# Altium schematic symbol library jlcpcb_2025_04_capacitors_extended_1206.schlib: 2503 symbols (part 10 of 14) (continued)
## FS31X475K250EPG (continued)

## FV31N100J102PXG
designator C?  Capacitance: 10pF  (hidden comment: *)
Capacitor, Ceramic (MLCC), 10pF, ±5%, 1kV, C0G, ±5%, SMD 1206; Manufacturer: PSA(Prosperity Dielectrics); Manufacturer Part Number: FV31N100J102PXG; Package Size: 1206; JLCPCB Basic Part: No; JLCPCB Part Number: C565683; Supplier 1: LCSC; Category: Capacitors - MLCC; Supplier Part Number 1: C565683; Tolerance: ±5%; Voltage Rating: 1kV; Temperature Coefficient: C0G; RoHS: Yes; ComponentLink1Description: Datasheet; ComponentLink1URL: https://wmsc.lcsc.com/wmsc/upload/file/pdf/v2/lcsc/2304140030_PSA-Prosperity-Dielectrics-FV31N100J102PXG_C565683.pdf; ComponentLink2Description: JLCPCB Part URL; ComponentLink2URL: https://jlcpcb.com/partdetail/C565683; ComponentLink3Description: LCSC Part URL; ComponentLink3URL: https://lcsc.com/product-detail/Multilayer-Ceramic-Capacitors-MLCC---SMD-SMT_PSAProsperity-Dielectrics-PSAProsperity-Dielectrics-FV31N100J102PXG_C565683.html
footprint CAP-1206 (1206 (3216M) Capacitor)
pins: 1, 2

## FV31N101J102ECG
designator C?  Capacitance: 100pF  (hidden comment: *)
Capacitor, Ceramic (MLCC), 100pF, ±5%, 1kV, C0G, ±5%, SMD 1206; Manufacturer: PSA(Prosperity Dielectrics); Manufacturer Part Number: FV31N101J102ECG; Package Size: 1206; JLCPCB Basic Part: No; JLCPCB Part Number: C382206; Supplier 1: LCSC; Category: Capacitors - MLCC; Supplier Part Number 1: C382206; Tolerance: ±5%; Voltage Rating: 1kV; Temperature Coefficient: C0G; RoHS: Yes; ComponentLink1Description: Datasheet; ComponentLink1URL: https://wmsc.lcsc.com/wmsc/upload/file/pdf/v2/lcsc/2304140030_PSA-Prosperity-Dielectrics-FV31N101J102ECG_C382206.pdf; ComponentLink2Description: JLCPCB Part URL; ComponentLink2URL: https://jlcpcb.com/partdetail/C382206; ComponentLink3Description: LCSC Part URL; ComponentLink3URL: https://lcsc.com/product-detail/Multilayer-Ceramic-Capacitors-MLCC---SMD-SMT_PSAProsperity-Dielectrics-PSAProsperity-Dielectrics-FV31N101J102ECG_C382206.html
footprint CAP-1206 (1206 (3216M) Capacitor)
pins: 1, 2

## FV31N101J102PXG
designator C?  Capacitance: 100pF  (hidden comment: *)
Capacitor, Ceramic (MLCC), 100pF, ±5%, 1kV, C0G, ±5%, SMD 1206; Manufacturer: PSA(Prosperity Dielectrics); Manufacturer Part Number: FV31N101J102PXG; Package Size: 1206; JLCPCB Basic Part: No; JLCPCB Part Number: C525354; Supplier 1: LCSC; Category: Capacitors - MLCC; Supplier Part Number 1: C525354; Tolerance: ±5%; Voltage Rating: 1kV; Temperature Coefficient: C0G; RoHS: Yes; ComponentLink1Description: Datasheet; ComponentLink1URL: https://wmsc.lcsc.com/wmsc/upload/file/pdf/v2/lcsc/2304140030_PSA-Prosperity-Dielectrics-FV31N101J102PXG_C525354.pdf; ComponentLink2Description: JLCPCB Part URL; ComponentLink2URL: https://jlcpcb.com/partdetail/C525354; ComponentLink3Description: LCSC Part URL; ComponentLink3URL: https://lcsc.com/product-detail/Multilayer-Ceramic-Capacitors-MLCC---SMD-SMT_PSAProsperity-Dielectrics-PSAProsperity-Dielectrics-FV31N101J102PXG_C525354.html
footprint CAP-1206 (1206 (3216M) Capacitor)
pins: 1, 2

## FV31N101J202ECG
designator C?  Capacitance: 100pF  (hidden comment: *)
Capacitor, Ceramic (MLCC), 100pF, ±5%, 2kV, C0G, ±5%, SMD 1206; Manufacturer: PSA(Prosperity Dielectrics); Manufacturer Part Number: FV31N101J202ECG; Package Size: 1206; JLCPCB Basic Part: No; JLCPCB Part Number: C382205; Supplier 1: LCSC; Category: Capacitors - MLCC; Supplier Part Number 1: C382205; Tolerance: ±5%; Voltage Rating: 2kV; Temperature Coefficient: C0G; RoHS: Yes; ComponentLink1Description: Datasheet; ComponentLink1URL: https://wmsc.lcsc.com/wmsc/upload/file/pdf/v2/lcsc/2304140030_PSA-Prosperity-Dielectrics-FV31N101J202ECG_C382205.pdf; ComponentLink2Description: JLCPCB Part URL; ComponentLink2URL: https://jlcpcb.com/partdetail/C382205; ComponentLink3Description: LCSC Part URL; ComponentLink3URL: https://lcsc.com/product-detail/Multilayer-Ceramic-Capacitors-MLCC---SMD-SMT_PSAProsperity-Dielectrics-PSAProsperity-Dielectrics-FV31N101J202ECG_C382205.html
footprint CAP-1206 (1206 (3216M) Capacitor)
pins: 1, 2

## FV31N120J102PXG
designator C?  Capacitance: 12pF  (hidden comment: *)
Capacitor, Ceramic (MLCC), 12pF, ±5%, 1kV, C0G, ±5%, SMD 1206; Manufacturer: PSA(Prosperity Dielectrics); Manufacturer Part Number: FV31N120J102PXG; Package Size: 1206; JLCPCB Basic Part: No; JLCPCB Part Number: C565684; Supplier 1: LCSC; Category: Capacitors - MLCC; Supplier Part Number 1: C565684; Tolerance: ±5%; Voltage Rating: 1kV; Temperature Coefficient: C0G; RoHS: Yes; ComponentLink1Description: Datasheet; ComponentLink1URL: https://wmsc.lcsc.com/wmsc/upload/file/pdf/v2/lcsc/2304140030_PSA-Prosperity-Dielectrics-FV31N120J102PXG_C565684.pdf; ComponentLink2Description: JLCPCB Part URL; ComponentLink2URL: https://jlcpcb.com/partdetail/C565684; ComponentLink3Description: LCSC Part URL; ComponentLink3URL: https://lcsc.com/product-detail/Multilayer-Ceramic-Capacitors-MLCC---SMD-SMT_PSAProsperity-Dielectrics-PSAProsperity-Dielectrics-FV31N120J102PXG_C565684.html
footprint CAP-1206 (1206 (3216M) Capacitor)
pins: 1, 2

## FV31N150J102PXG
designator C?  Capacitance: 15pF  (hidden comment: *)
Capacitor, Ceramic (MLCC), 15pF, ±5%, 1kV, NP0, ±5%, SMD 1206; Manufacturer: PSA(Prosperity Dielectrics); Manufacturer Part Number: FV31N150J102PXG; Package Size: 1206; JLCPCB Basic Part: No; JLCPCB Part Number: C565685; Supplier 1: LCSC; Category: Capacitors - MLCC; Supplier Part Number 1: C565685; Tolerance: ±5%; Voltage Rating: 1kV; Temperature Coefficient: NP0; RoHS: Yes; ComponentLink1Description: Datasheet; ComponentLink1URL: https://wmsc.lcsc.com/wmsc/upload/file/pdf/v2/lcsc/2304140030_PSA-Prosperity-Dielectrics-FV31N150J102PXG_C565685.pdf; ComponentLink2Description: JLCPCB Part URL; ComponentLink2URL: https://jlcpcb.com/partdetail/C565685; ComponentLink3Description: LCSC Part URL; ComponentLink3URL: https://lcsc.com/product-detail/Multilayer-Ceramic-Capacitors-MLCC---SMD-SMT_PSAProsperity-Dielectrics-PSAProsperity-Dielectrics-FV31N150J102PXG_C565685.html
footprint CAP-1206 (1206 (3216M) Capacitor)
pins: 1, 2

## FV31N180J102PXG
designator C?  Capacitance: 18pF  (hidden comment: *)
Capacitor, Ceramic (MLCC), 18pF, ±5%, 1kV, C0G, ±5%, SMD 1206; Manufacturer: PSA(Prosperity Dielectrics); Manufacturer Part Number: FV31N180J102PXG; Package Size: 1206; JLCPCB Basic Part: No; JLCPCB Part Number: C565686; Supplier 1: LCSC; Category: Capacitors - MLCC; Supplier Part Number 1: C565686; Tolerance: ±5%; Voltage Rating: 1kV; Temperature Coefficient: C0G; RoHS: Yes; ComponentLink1Description: Datasheet; ComponentLink1URL: https://wmsc.lcsc.com/wmsc/upload/file/pdf/v2/lcsc/2304140030_PSA-Prosperity-Dielectrics-FV31N180J102PXG_C565686.pdf; ComponentLink2Description: JLCPCB Part URL; ComponentLink2URL: https://jlcpcb.com/partdetail/C565686; ComponentLink3Description: LCSC Part URL; ComponentLink3URL: https://lcsc.com/product-detail/Multilayer-Ceramic-Capacitors-MLCC---SMD-SMT_PSAProsperity-Dielectrics-PSAProsperity-Dielectrics-FV31N180J102PXG_C565686.html
footprint CAP-1206 (1206 (3216M) Capacitor)
pins: 1, 2

## FV31N220J102PXG
designator C?  Capacitance: 22pF  (hidden comment: *)
Capacitor, Ceramic (MLCC), 22pF, ±5%, 1kV, C0G, ±5%, SMD 1206; Manufacturer: PSA(Prosperity Dielectrics); Manufacturer Part Number: FV31N220J102PXG; Package Size: 1206; JLCPCB Basic Part: No; JLCPCB Part Number: C565687; Supplier 1: LCSC; Category: Capacitors - MLCC; Supplier Part Number 1: C565687; Tolerance: ±5%; Voltage Rating: 1kV; Temperature Coefficient: C0G; RoHS: Yes; ComponentLink1Description: Datasheet; ComponentLink1URL: https://wmsc.lcsc.com/wmsc/upload/file/pdf/v2/lcsc/2304140030_PSA-Prosperity-Dielectrics-FV31N220J102PXG_C565687.pdf; ComponentLink2Description: JLCPCB Part URL; ComponentLink2URL: https://jlcpcb.com/partdetail/C565687; ComponentLink3Description: LCSC Part URL; ComponentLink3URL: https://lcsc.com/product-detail/Multilayer-Ceramic-Capacitors-MLCC---SMD-SMT_PSAProsperity-Dielectrics-PSAProsperity-Dielectrics-FV31N220J102PXG_C565687.html
footprint CAP-1206 (1206 (3216M) Capacitor)
pins: 1, 2

## FV31N221J102EEG
designator C?  Capacitance: 220pF  (hidden comment: *)
Capacitor, Ceramic (MLCC), 220pF, 1kV, C0G, SMD 1206; Manufacturer: PSA(Prosperity Dielectrics); Manufacturer Part Number: FV31N221J102EEG; Package Size: 1206; JLCPCB Basic Part: No; JLCPCB Part Number: C2929201; Supplier 1: LCSC; Category: Capacitors - MLCC; Supplier Part Number 1: C2929201; Voltage Rating: 1kV; Temperature Coefficient: C0G; RoHS: Yes; ComponentLink1Description: Datasheet; ComponentLink1URL: https://wmsc.lcsc.com/wmsc/upload/file/pdf/v2/lcsc/2201121400_PSA-Prosperity-Dielectrics-FV31N221J102EEG_C2929201.pdf; ComponentLink2Description: JLCPCB Part URL; ComponentLink2URL: https://jlcpcb.com/partdetail/C2929201; ComponentLink3Description: LCSC Part URL; ComponentLink3URL: https://lcsc.com/product-detail/Multilayer-Ceramic-Capacitors-MLCC---SMD-SMT_PSAProsperity-Dielectrics-PSAProsperity-Dielectrics-FV31N221J102EEG_C2929201.html
footprint CAP-1206 (1206 (3216M) Capacitor)
pins: 1, 2

## FV31N270J102PXG
designator C?  Capacitance: 27pF  (hidden comment: *)
Capacitor, Ceramic (MLCC), 27pF, ±5%, 1kV, C0G, ±5%, SMD 1206; Manufacturer: PSA(Prosperity Dielectrics); Manufacturer Part Number: FV31N270J102PXG; Package Size: 1206; JLCPCB Basic Part: No; JLCPCB Part Number: C565688; Supplier 1: LCSC; Category: Capacitors - MLCC; Supplier Part Number 1: C565688; Tolerance: ±5%; Voltage Rating: 1kV; Temperature Coefficient: C0G; RoHS: Yes; ComponentLink1Description: Datasheet; ComponentLink1URL: https://wmsc.lcsc.com/wmsc/upload/file/pdf/v2/lcsc/2304140030_PSA-Prosperity-Dielectrics-FV31N270J102PXG_C565688.pdf; ComponentLink2Description: JLCPCB Part URL; ComponentLink2URL: https://jlcpcb.com/partdetail/C565688; ComponentLink3Description: LCSC Part URL; ComponentLink3URL: https://lcsc.com/product-detail/Multilayer-Ceramic-Capacitors-MLCC---SMD-SMT_PSAProsperity-Dielectrics-PSAProsperity-Dielectrics-FV31N270J102PXG_C565688.html
footprint CAP-1206 (1206 (3216M) Capacitor)
pins: 1, 2

## FV31N330J102PXG
designator C?  Capacitance: 33pF  (hidden comment: *)
Capacitor, Ceramic (MLCC), 33pF, ±5%, 1kV, C0G, ±5%, SMD 1206; Manufacturer: PSA(Prosperity Dielectrics); Manufacturer Part Number: FV31N330J102PXG; Package Size: 1206; JLCPCB Basic Part: No; JLCPCB Part Number: C565689; Supplier 1: LCSC; Category: Capacitors - MLCC; Supplier Part Number 1: C565689; Tolerance: ±5%; Voltage Rating: 1kV; Temperature Coefficient: C0G; RoHS: Yes; ComponentLink1Description: Datasheet; ComponentLink1URL: https://wmsc.lcsc.com/wmsc/upload/file/pdf/v2/lcsc/2304140030_PSA-Prosperity-Dielectrics-FV31N330J102PXG_C565689.pdf; ComponentLink2Description: JLCPCB Part URL; ComponentLink2URL: https://jlcpcb.com/partdetail/C565689; ComponentLink3Description: LCSC Part URL; ComponentLink3URL: https://lcsc.com/product-detail/Multilayer-Ceramic-Capacitors-MLCC---SMD-SMT_PSAProsperity-Dielectrics-PSAProsperity-Dielectrics-FV31N330J102PXG_C565689.html
footprint CAP-1206 (1206 (3216M) Capacitor)
pins: 1, 2

## FV31N331J102EEG
designator C?  Capacitance: 330pF  (hidden comment: *)
Capacitor, Ceramic (MLCC), 330pF, ±5%, 1kV, C0G, ±5%, SMD 1206; Manufacturer: PSA(Prosperity Dielectrics); Manufacturer Part Number: FV31N331J102EEG; Package Size: 1206; JLCPCB Basic Part: No; JLCPCB Part Number: C146193; Supplier 1: LCSC; Category: Capacitors - MLCC; Supplier Part Number 1: C146193; Tolerance: ±5%; Voltage Rating: 1kV; Temperature Coefficient: C0G; RoHS: Yes; ComponentLink1Description: Datasheet; ComponentLink1URL: https://wmsc.lcsc.com/wmsc/upload/file/pdf/v2/lcsc/2304140030_PSA-Prosperity-Dielectrics-FV31N331J102EEG_C146193.pdf; ComponentLink2Description: JLCPCB Part URL; ComponentLink2URL: https://jlcpcb.com/partdetail/C146193; ComponentLink3Description: LCSC Part URL; ComponentLink3URL: https://lcsc.com/product-detail/Multilayer-Ceramic-Capacitors-MLCC---SMD-SMT_PSAProsperity-Dielectrics-PSAProsperity-Dielectrics-FV31N331J102EEG_C146193.html
footprint CAP-1206 (1206 (3216M) Capacitor)
pins: 1, 2

## FV31N390J102PXG
designator C?  Capacitance: 39pF  (hidden comment: *)
Capacitor, Ceramic (MLCC), 39pF, ±5%, 1kV, C0G, ±5%, SMD 1206; Manufacturer: PSA(Prosperity Dielectrics); Manufacturer Part Number: FV31N390J102PXG; Package Size: 1206; JLCPCB Basic Part: No; JLCPCB Part Number: C565690; Supplier 1: LCSC; Category: Capacitors - MLCC; Supplier Part Number 1: C565690; Tolerance: ±5%; Voltage Rating: 1kV; Temperature Coefficient: C0G; RoHS: Yes; ComponentLink1Description: Datasheet; ComponentLink1URL: https://wmsc.lcsc.com/wmsc/upload/file/pdf/v2/lcsc/2304140030_PSA-Prosperity-Dielectrics-FV31N390J102PXG_C565690.pdf; ComponentLink2Description: JLCPCB Part URL; ComponentLink2URL: https://jlcpcb.com/partdetail/C565690; ComponentLink3Description: LCSC Part URL; ComponentLink3URL: https://lcsc.com/product-detail/Multilayer-Ceramic-Capacitors-MLCC---SMD-SMT_PSAProsperity-Dielectrics-PSAProsperity-Dielectrics-FV31N390J102PXG_C565690.html
footprint CAP-1206 (1206 (3216M) Capacitor)
pins: 1, 2

## FV31N470J102ECG
designator C?  Capacitance: 47pF  (hidden comment: *)
Capacitor, Ceramic (MLCC), 47pF, ±5%, 1kV, C0G, ±5%, SMD 1206; Manufacturer: PSA(Prosperity Dielectrics); Manufacturer Part Number: FV31N470J102ECG; Package Size: 1206; JLCPCB Basic Part: No; JLCPCB Part Number: C701364; Supplier 1: LCSC; Category: Capacitors - MLCC; Supplier Part Number 1: C701364; Tolerance: ±5%; Voltage Rating: 1kV; Temperature Coefficient: C0G; RoHS: Yes; ComponentLink1Description: Datasheet; ComponentLink1URL: https://wmsc.lcsc.com/wmsc/upload/file/pdf/v2/lcsc/2304140030_PSA-Prosperity-Dielectrics-FV31N470J102ECG_C701364.pdf; ComponentLink2Description: JLCPCB Part URL; ComponentLink2URL: https://jlcpcb.com/partdetail/C701364; ComponentLink3Description: LCSC Part URL; ComponentLink3URL: https://lcsc.com/product-detail/Multilayer-Ceramic-Capacitors-MLCC---SMD-SMT_PSAProsperity-Dielectrics-PSAProsperity-Dielectrics-FV31N470J102ECG_C701364.html
footprint CAP-1206 (1206 (3216M) Capacitor)
pins: 1, 2

## FV31N470J102EMG
designator C?  Capacitance: 47pF  (hidden comment: *)
Capacitor, Ceramic (MLCC), 47pF, ±5%, 1kV, C0G, ±5%, SMD 1206; Manufacturer: PSA(Prosperity Dielectrics); Manufacturer Part Number: FV31N470J102EMG; Package Size: 1206; JLCPCB Basic Part: No; JLCPCB Part Number: C382204; Supplier 1: LCSC; Category: Capacitors - MLCC; Supplier Part Number 1: C382204; Tolerance: ±5%; Voltage Rating: 1kV; Temperature Coefficient: C0G; RoHS: Yes; ComponentLink1Description: Datasheet; ComponentLink1URL: https://wmsc.lcsc.com/wmsc/upload/file/pdf/v2/lcsc/2304140030_PSA-Prosperity-Dielectrics-FV31N470J102EMG_C382204.pdf; ComponentLink2Description: JLCPCB Part URL; ComponentLink2URL: https://jlcpcb.com/partdetail/C382204; ComponentLink3Description: LCSC Part URL; ComponentLink3URL: https://lcsc.com/product-detail/Multilayer-Ceramic-Capacitors-MLCC---SMD-SMT_PSAProsperity-Dielectrics-PSAProsperity-Dielectrics-FV31N470J102EMG_C382204.html
footprint CAP-1206 (1206 (3216M) Capacitor)
pins: 1, 2

## FV31N471J102EEG
designator C?  Capacitance: 470pF  (hidden comment: *)
Capacitor, Ceramic (MLCC), 470pF, ±5%, 1kV, C0G, ±5%, SMD 1206; Manufacturer: PSA(Prosperity Dielectrics); Manufacturer Part Number: FV31N471J102EEG; Package Size: 1206; JLCPCB Basic Part: No; JLCPCB Part Number: C382203; Supplier 1: LCSC; Category: Capacitors - MLCC; Supplier Part Number 1: C382203; Tolerance: ±5%; Voltage Rating: 1kV; Temperature Coefficient: C0G; RoHS: Yes; ComponentLink1Description: Datasheet; ComponentLink1URL: https://wmsc.lcsc.com/wmsc/upload/file/pdf/v2/lcsc/2304140030_PSA-Prosperity-Dielectrics-FV31N471J102EEG_C382203.pdf; ComponentLink2Description: JLCPCB Part URL; ComponentLink2URL: https://jlcpcb.com/partdetail/C382203; ComponentLink3Description: LCSC Part URL; ComponentLink3URL: https://lcsc.com/product-detail/Multilayer-Ceramic-Capacitors-MLCC---SMD-SMT_PSAProsperity-Dielectrics-PSAProsperity-Dielectrics-FV31N471J102EEG_C382203.html
footprint CAP-1206 (1206 (3216M) Capacitor)
pins: 1, 2

## FV31N560J102EMG
designator C?  Capacitance: 56pF  (hidden comment: *)
Capacitor, Ceramic (MLCC), 56pF, ±5%, 1kV, C0G, ±5%, SMD 1206; Manufacturer: PSA(Prosperity Dielectrics); Manufacturer Part Number: FV31N560J102EMG; Package Size: 1206; JLCPCB Basic Part: No; JLCPCB Part Number: C565691; Supplier 1: LCSC; Category: Capacitors - MLCC; Supplier Part Number 1: C565691; Tolerance: ±5%; Voltage Rating: 1kV; Temperature Coefficient: C0G; RoHS: Yes; ComponentLink1Description: Datasheet; ComponentLink1URL: https://wmsc.lcsc.com/wmsc/upload/file/pdf/v2/lcsc/2304140030_PSA-Prosperity-Dielectrics-FV31N560J102EMG_C565691.pdf; ComponentLink2Description: JLCPCB Part URL; ComponentLink2URL: https://jlcpcb.com/partdetail/C565691; ComponentLink3Description: LCSC Part URL; ComponentLink3URL: https://lcsc.com/product-detail/Multilayer-Ceramic-Capacitors-MLCC---SMD-SMT_PSAProsperity-Dielectrics-PSAProsperity-Dielectrics-FV31N560J102EMG_C565691.html
footprint CAP-1206 (1206 (3216M) Capacitor)
pins: 1, 2

## FV31N680J102EMG
designator C?  Capacitance: 68pF  (hidden comment: *)
Capacitor, Ceramic (MLCC), 68pF, ±5%, 1kV, C0G, ±5%, SMD 1206; Manufacturer: PSA(Prosperity Dielectrics); Manufacturer Part Number: FV31N680J102EMG; Package Size: 1206; JLCPCB Basic Part: No; JLCPCB Part Number: C525355; Supplier 1: LCSC; Category: Capacitors - MLCC; Supplier Part Number 1: C525355; Tolerance: ±5%; Voltage Rating: 1kV; Temperature Coefficient: C0G; RoHS: Yes; ComponentLink1Description: Datasheet; ComponentLink1URL: https://wmsc.lcsc.com/wmsc/upload/file/pdf/v2/lcsc/2304140030_PSA-Prosperity-Dielectrics-FV31N680J102EMG_C525355.pdf; ComponentLink2Description: JLCPCB Part URL; ComponentLink2URL: https://jlcpcb.com/partdetail/C525355; ComponentLink3Description: LCSC Part URL; ComponentLink3URL: https://lcsc.com/product-detail/Multilayer-Ceramic-Capacitors-MLCC---SMD-SMT_PSAProsperity-Dielectrics-PSAProsperity-Dielectrics-FV31N680J102EMG_C525355.html
footprint CAP-1206 (1206 (3216M) Capacitor)
pins: 1, 2

## FV31N820J102ECG
designator C?  Capacitance: 82pF  (hidden comment: *)
Capacitor, Ceramic (MLCC), 82pF, ±5%, 1kV, NP0, ±5%, SMD 1206; Manufacturer: PSA(Prosperity Dielectrics); Manufacturer Part Number: FV31N820J102ECG; Package Size: 1206; JLCPCB Basic Part: No; JLCPCB Part Number: C565692; Supplier 1: LCSC; Category: Capacitors - MLCC; Supplier Part Number 1: C565692; Tolerance: ±5%; Voltage Rating: 1kV; Temperature Coefficient: NP0; RoHS: Yes; ComponentLink1Description: Datasheet; ComponentLink1URL: https://wmsc.lcsc.com/wmsc/upload/file/pdf/v2/lcsc/2304140030_PSA-Prosperity-Dielectrics-FV31N820J102ECG_C565692.pdf; ComponentLink2Description: JLCPCB Part URL; ComponentLink2URL: https://jlcpcb.com/partdetail/C565692; ComponentLink3Description: LCSC Part URL; ComponentLink3URL: https://lcsc.com/product-detail/Multilayer-Ceramic-Capacitors-MLCC---SMD-SMT_PSAProsperity-Dielectrics-PSAProsperity-Dielectrics-FV31N820J102ECG_C565692.html
footprint CAP-1206 (1206 (3216M) Capacitor)
pins: 1, 2

## FV31N821J102EEG
designator C?  Capacitance: 820pF  (hidden comment: *)
Capacitor, Ceramic (MLCC), 820pF, 1kV, C0G, SMD 1206; Manufacturer: PSA(Prosperity Dielectrics); Manufacturer Part Number: FV31N821J102EEG; Package Size: 1206; JLCPCB Basic Part: No; JLCPCB Part Number: C2929730; Supplier 1: LCSC; Category: Capacitors - MLCC; Supplier Part Number 1: C2929730; Voltage Rating: 1kV; Temperature Coefficient: C0G; RoHS: Yes; ComponentLink1Description: Datasheet; ComponentLink1URL: https://wmsc.lcsc.com/wmsc/upload/file/pdf/v2/lcsc/2205181645_PSA-Prosperity-Dielectrics-FV31N821J102EEG_C2929730.pdf; ComponentLink2Description: JLCPCB Part URL; ComponentLink2URL: https://jlcpcb.com/partdetail/C2929730; ComponentLink3Description: LCSC Part URL; ComponentLink3URL: https://lcsc.com/product-detail/Multilayer-Ceramic-Capacitors-MLCC---SMD-SMT_PSAProsperity-Dielectrics-PSAProsperity-Dielectrics-FV31N821J102EEG_C2929730.html
footprint CAP-1206 (1206 (3216M) Capacitor)
pins: 1, 2

## FV31X102K102ECG
designator C?  Capacitance: 1nF  (hidden comment: *)
Capacitor, Ceramic (MLCC), 1nF, ±10%, 1kV, X7R, ±10%, SMD 1206; Manufacturer: PSA(Prosperity Dielectrics); Manufacturer Part Number: FV31X102K102ECG; Package Size: 1206; JLCPCB Basic Part: No; JLCPCB Part Number: C525356; Supplier 1: LCSC; Category: Capacitors - MLCC; Supplier Part Number 1: C525356; Tolerance: ±10%; Voltage Rating: 1kV; Temperature Coefficient: X7R; RoHS: Yes; ComponentLink1Description: Datasheet; ComponentLink1URL: https://wmsc.lcsc.com/wmsc/upload/file/pdf/v2/lcsc/2304140030_PSA-Prosperity-Dielectrics-FV31X102K102ECG_C525356.pdf; ComponentLink2Description: JLCPCB Part URL; ComponentLink2URL: https://jlcpcb.com/partdetail/C525356; ComponentLink3Description: LCSC Part URL; ComponentLink3URL: https://lcsc.com/product-detail/Multilayer-Ceramic-Capacitors-MLCC---SMD-SMT_PSAProsperity-Dielectrics-PSAProsperity-Dielectrics-FV31X102K102ECG_C525356.html
footprint CAP-1206 (1206 (3216M) Capacitor)
pins: 1, 2

## FV31X102K202ECG
designator C?  Capacitance: 1nF  (hidden comment: *)
Capacitor, Ceramic (MLCC), 1nF, ±10%, 2kV, X7R, ±10%, SMD 1206; Manufacturer: PSA(Prosperity Dielectrics); Manufacturer Part Number: FV31X102K202ECG; Package Size: 1206; JLCPCB Basic Part: No; JLCPCB Part Number: C235728; Supplier 1: LCSC; Category: Capacitors - MLCC; Supplier Part Number 1: C235728; Tolerance: ±10%; Voltage Rating: 2kV; Temperature Coefficient: X7R; RoHS: Yes; ComponentLink1Description: Datasheet; ComponentLink1URL: https://wmsc.lcsc.com/wmsc/upload/file/pdf/v2/lcsc/2304140030_PSA-Prosperity-Dielectrics-FV31X102K202ECG_C235728.pdf; ComponentLink2Description: JLCPCB Part URL; ComponentLink2URL: https://jlcpcb.com/partdetail/C235728; ComponentLink3Description: LCSC Part URL; ComponentLink3URL: https://lcsc.com/product-detail/Multilayer-Ceramic-Capacitors-MLCC---SMD-SMT_PSAProsperity-Dielectrics-PSAProsperity-Dielectrics-FV31X102K202ECG_C235728.html
footprint CAP-1206 (1206 (3216M) Capacitor)
pins: 1, 2

## FV31X102K202PXG
designator C?  Capacitance: 1nF  (hidden comment: *)
Capacitor, Ceramic (MLCC), 1nF, ±10%, 2kV, X7R, ±10%, SMD 1206; Manufacturer: PSA(Prosperity Dielectrics); Manufacturer Part Number: FV31X102K202PXG; Package Size: 1206; JLCPCB Basic Part: No; JLCPCB Part Number: C363565; Supplier 1: LCSC; Category: Capacitors - MLCC; Supplier Part Number 1: C363565; Tolerance: ±10%; Voltage Rating: 2kV; Temperature Coefficient: X7R; RoHS: Yes; ComponentLink1Description: Datasheet; ComponentLink1URL: https://wmsc.lcsc.com/wmsc/upload/file/pdf/v2/lcsc/2304140030_PSA-Prosperity-Dielectrics-FV31X102K202PXG_C363565.pdf; ComponentLink2Description: JLCPCB Part URL; ComponentLink2URL: https://jlcpcb.com/partdetail/C363565; ComponentLink3Description: LCSC Part URL; ComponentLink3URL: https://lcsc.com/product-detail/Multilayer-Ceramic-Capacitors-MLCC---SMD-SMT_PSAProsperity-Dielectrics-PSAProsperity-Dielectrics-FV31X102K202PXG_C363565.html
footprint CAP-1206 (1206 (3216M) Capacitor)
pins: 1, 2

## FV31X103K102ECG
designator C?  Capacitance: 10nF  (hidden comment: *)
Capacitor, Ceramic (MLCC), 10nF, ±10%, 1kV, X7R, ±10%, SMD 1206; Manufacturer: PSA(Prosperity Dielectrics); Manufacturer Part Number: FV31X103K102ECG; Package Size: 1206; JLCPCB Basic Part: No; JLCPCB Part Number: C394163; Supplier 1: LCSC; Category: Capacitors - MLCC; Supplier Part Number 1: C394163; Tolerance: ±10%; Voltage Rating: 1kV; Temperature Coefficient: X7R; RoHS: Yes; ComponentLink1Description: Datasheet; ComponentLink1URL: https://wmsc.lcsc.com/wmsc/upload/file/pdf/v2/lcsc/2304140030_PSA-Prosperity-Dielectrics-FV31X103K102ECG_C394163.pdf; ComponentLink2Description: JLCPCB Part URL; ComponentLink2URL: https://jlcpcb.com/partdetail/C394163; ComponentLink3Description: LCSC Part URL; ComponentLink3URL: https://lcsc.com/product-detail/Multilayer-Ceramic-Capacitors-MLCC---SMD-SMT_PSAProsperity-Dielectrics-PSAProsperity-Dielectrics-FV31X103K102ECG_C394163.html
footprint CAP-1206 (1206 (3216M) Capacitor)
pins: 1, 2

## FV31X153K102EEG
designator C?  Capacitance: 15nF  (hidden comment: *)
Capacitor, Ceramic (MLCC), 15nF, 1kV, X7R, SMD 1206; Manufacturer: PSA(Prosperity Dielectrics); Manufacturer Part Number: FV31X153K102EEG; Package Size: 1206; JLCPCB Basic Part: No; JLCPCB Part Number: C2915714; Supplier 1: LCSC; Category: Capacitors - MLCC; Supplier Part Number 1: C2915714; Voltage Rating: 1kV; Temperature Coefficient: X7R; RoHS: Yes; ComponentLink1Description: Datasheet; ComponentLink1URL: https://wmsc.lcsc.com/wmsc/upload/file/pdf/v2/lcsc/2203101903_PSA-Prosperity-Dielectrics-FV31X153K102EEG_C2915714.pdf; ComponentLink2Description: JLCPCB Part URL; ComponentLink2URL: https://jlcpcb.com/partdetail/C2915714; ComponentLink3Description: LCSC Part URL; ComponentLink3URL: https://lcsc.com/product-detail/Multilayer-Ceramic-Capacitors-MLCC---SMD-SMT_PSAProsperity-Dielectrics-PSAProsperity-Dielectrics-FV31X153K102EEG_C2915714.html
footprint CAP-1206 (1206 (3216M) Capacitor)
pins: 1, 2

## FV31X221K202ECG
designator C?  Capacitance: 220pF  (hidden comment: *)
Capacitor, Ceramic (MLCC), 220pF, ±10%, 2kV, ±10%, SMD 1206; Manufacturer: PSA(Prosperity Dielectrics); Manufacturer Part Number: FV31X221K202ECG; Package Size: 1206; JLCPCB Basic Part: No; JLCPCB Part Number: C2843398; Supplier 1: LCSC; Category: Capacitors - MLCC; Supplier Part Number 1: C2843398; Tolerance: ±10%; Voltage Rating: 2kV; RoHS: Yes; ComponentLink1Description: Datasheet; ComponentLink1URL: https://wmsc.lcsc.com/wmsc/upload/file/pdf/v2/lcsc/2108072030_PSA-Prosperity-Dielectrics-FV31X221K202ECG_C2843398.pdf; ComponentLink2Description: JLCPCB Part URL; ComponentLink2URL: https://jlcpcb.com/partdetail/C2843398; ComponentLink3Description: LCSC Part URL; ComponentLink3URL: https://lcsc.com/product-detail/Multilayer-Ceramic-Capacitors-MLCC---SMD-SMT_PSAProsperity-Dielectrics-PSAProsperity-Dielectrics-FV31X221K202ECG_C2843398.html
footprint CAP-1206 (1206 (3216M) Capacitor)
pins: 1, 2

## FV31X222K102ECG
designator C?  Capacitance: 2.2nF  (hidden comment: *)
Capacitor, Ceramic (MLCC), 2.2nF, 1kV, SMD 1206; Manufacturer: PSA(Prosperity Dielectrics); Manufacturer Part Number: FV31X222K102ECG; Package Size: 1206; JLCPCB Basic Part: No; JLCPCB Part Number: C2836879; Supplier 1: LCSC; Category: Capacitors - MLCC; Supplier Part Number 1: C2836879; Voltage Rating: 1kV; RoHS: Yes; ComponentLink1Description: Datasheet; ComponentLink1URL: https://wmsc.lcsc.com/wmsc/upload/file/pdf/v2/lcsc/2304140030_PSA-Prosperity-Dielectrics-FV31X222K102ECG_C2836879.pdf; ComponentLink2Description: JLCPCB Part URL; ComponentLink2URL: https://jlcpcb.com/partdetail/C2836879; ComponentLink3Description: LCSC Part URL; ComponentLink3URL: https://lcsc.com/product-detail/Multilayer-Ceramic-Capacitors-MLCC---SMD-SMT_PSAProsperity-Dielectrics-PSAProsperity-Dielectrics-FV31X222K102ECG_C2836879.html
footprint CAP-1206 (1206 (3216M) Capacitor)
pins: 1, 2

## FV31X222K202EEG
designator C?  Capacitance: 2.2nF  (hidden comment: *)
Capacitor, Ceramic (MLCC), 2.2nF, ±10%, 2kV, X7R, ±10%, SMD 1206; Manufacturer: PSA(Prosperity Dielectrics); Manufacturer Part Number: FV31X222K202EEG; Package Size: 1206; JLCPCB Basic Part: No; JLCPCB Part Number: C382202; Supplier 1: LCSC; Category: Capacitors - MLCC; Supplier Part Number 1: C382202; Tolerance: ±10%; Voltage Rating: 2kV; Temperature Coefficient: X7R; RoHS: Yes; ComponentLink1Description: Datasheet; ComponentLink1URL: https://wmsc.lcsc.com/wmsc/upload/file/pdf/v2/lcsc/2304140030_PSA-Prosperity-Dielectrics-FV31X222K202EEG_C382202.pdf; ComponentLink2Description: JLCPCB Part URL; ComponentLink2URL: https://jlcpcb.com/partdetail/C382202; ComponentLink3Description: LCSC Part URL; ComponentLink3URL: https://lcsc.com/product-detail/Multilayer-Ceramic-Capacitors-MLCC---SMD-SMT_PSAProsperity-Dielectrics-PSAProsperity-Dielectrics-FV31X222K202EEG_C382202.html
footprint CAP-1206 (1206 (3216M) Capacitor)
pins: 1, 2

## FV31X223K102EEG
designator C?  Capacitance: 22nF  (hidden comment: *)
Capacitor, Ceramic (MLCC), 22nF, ±10%, 1kV, ±10%, SMD 1206; Manufacturer: PSA(Prosperity Dielectrics); Manufacturer Part Number: FV31X223K102EEG; Package Size: 1206; JLCPCB Basic Part: No; JLCPCB Part Number: C1021604; Supplier 1: LCSC; Category: Capacitors - MLCC; Supplier Part Number 1: C1021604; Tolerance: ±10%; Voltage Rating: 1kV; RoHS: Yes; ComponentLink1Description: Datasheet; ComponentLink1URL: https://wmsc.lcsc.com/wmsc/upload/file/pdf/v2/lcsc/2012231312_PSA-Prosperity-Dielectrics-FV31X223K102EEG_C1021604.pdf; ComponentLink2Description: JLCPCB Part URL; ComponentLink2URL: https://jlcpcb.com/partdetail/C1021604; ComponentLink3Description: LCSC Part URL; ComponentLink3URL: https://lcsc.com/product-detail/Multilayer-Ceramic-Capacitors-MLCC---SMD-SMT_PSAProsperity-Dielectrics-PSAProsperity-Dielectrics-FV31X223K102EEG_C1021604.html
footprint CAP-1206 (1206 (3216M) Capacitor)
pins: 1, 2

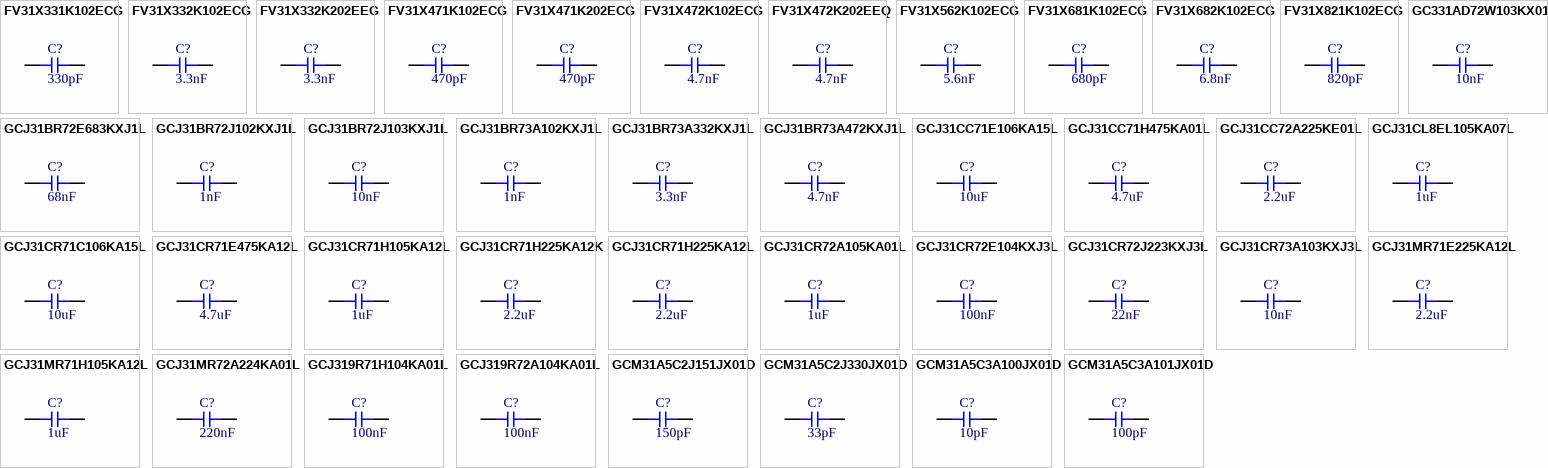
[diagram p43: symbols FV31X331K102ECG to GCM31A5C3A101JX01D]

## FV31X331K102ECG
designator C?  Capacitance: 330pF  (hidden comment: *)
Capacitor, Ceramic (MLCC), 330pF, ±10%, 1kV, X7R, ±10%, SMD 1206; Manufacturer: PSA(Prosperity Dielectrics); Manufacturer Part Number: FV31X331K102ECG; Package Size: 1206; JLCPCB Basic Part: No; JLCPCB Part Number: C565665; Supplier 1: LCSC; Category: Capacitors - MLCC; Supplier Part Number 1: C565665; Tolerance: ±10%; Voltage Rating: 1kV; Temperature Coefficient: X7R; RoHS: Yes; ComponentLink1Description: Datasheet; ComponentLink1URL: https://wmsc.lcsc.com/wmsc/upload/file/pdf/v2/lcsc/2304140030_PSA-Prosperity-Dielectrics-FV31X331K102ECG_C565665.pdf; ComponentLink2Description: JLCPCB Part URL; ComponentLink2URL: https://jlcpcb.com/partdetail/C565665; ComponentLink3Description: LCSC Part URL; ComponentLink3URL: https://lcsc.com/product-detail/Multilayer-Ceramic-Capacitors-MLCC---SMD-SMT_PSAProsperity-Dielectrics-PSAProsperity-Dielectrics-FV31X331K102ECG_C565665.html
footprint CAP-1206 (1206 (3216M) Capacitor)
pins: 1, 2

## FV31X332K102ECG
designator C?  Capacitance: 3.3nF  (hidden comment: *)
Capacitor, Ceramic (MLCC), 3.3nF, ±10%, 1kV, ±10%, SMD 1206; Manufacturer: PSA(Prosperity Dielectrics); Manufacturer Part Number: FV31X332K102ECG; Package Size: 1206; JLCPCB Basic Part: No; JLCPCB Part Number: C565666; Supplier 1: LCSC; Category: Capacitors - MLCC; Supplier Part Number 1: C565666; Tolerance: ±10%; Voltage Rating: 1kV; RoHS: Yes; ComponentLink1Description: Datasheet; ComponentLink1URL: https://wmsc.lcsc.com/wmsc/upload/file/pdf/v2/lcsc/2304140030_PSA-Prosperity-Dielectrics-FV31X332K102ECG_C565666.pdf; ComponentLink2Description: JLCPCB Part URL; ComponentLink2URL: https://jlcpcb.com/partdetail/C565666; ComponentLink3Description: LCSC Part URL; ComponentLink3URL: https://lcsc.com/product-detail/Multilayer-Ceramic-Capacitors-MLCC---SMD-SMT_PSAProsperity-Dielectrics-PSAProsperity-Dielectrics-FV31X332K102ECG_C565666.html
footprint CAP-1206 (1206 (3216M) Capacitor)
pins: 1, 2

## FV31X332K202EEG
designator C?  Capacitance: 3.3nF  (hidden comment: *)
Capacitor, Ceramic (MLCC), 3.3nF, ±10%, 2kV, ±10%, SMD 1206; Manufacturer: PSA(Prosperity Dielectrics); Manufacturer Part Number: FV31X332K202EEG; Package Size: 1206; JLCPCB Basic Part: No; JLCPCB Part Number: C1021603; Supplier 1: LCSC; Category: Capacitors - MLCC; Supplier Part Number 1: C1021603; Tolerance: ±10%; Voltage Rating: 2kV; RoHS: Yes; ComponentLink1Description: Datasheet; ComponentLink1URL: https://wmsc.lcsc.com/wmsc/upload/file/pdf/v2/lcsc/2304140030_PSA-Prosperity-Dielectrics-FV31X332K202EEG_C1021603.pdf; ComponentLink2Description: JLCPCB Part URL; ComponentLink2URL: https://jlcpcb.com/partdetail/C1021603; ComponentLink3Description: LCSC Part URL; ComponentLink3URL: https://lcsc.com/product-detail/Multilayer-Ceramic-Capacitors-MLCC---SMD-SMT_PSAProsperity-Dielectrics-PSAProsperity-Dielectrics-FV31X332K202EEG_C1021603.html
footprint CAP-1206 (1206 (3216M) Capacitor)
pins: 1, 2

## FV31X471K102ECG
designator C?  Capacitance: 470pF  (hidden comment: *)
Capacitor, Ceramic (MLCC), 470pF, ±10%, 1kV, X7R, ±10%, SMD 1206; Manufacturer: PSA(Prosperity Dielectrics); Manufacturer Part Number: FV31X471K102ECG; Package Size: 1206; JLCPCB Basic Part: No; JLCPCB Part Number: C525358; Supplier 1: LCSC; Category: Capacitors - MLCC; Supplier Part Number 1: C525358; Tolerance: ±10%; Voltage Rating: 1kV; Temperature Coefficient: X7R; RoHS: Yes; ComponentLink1Description: Datasheet; ComponentLink1URL: https://wmsc.lcsc.com/wmsc/upload/file/pdf/v2/lcsc/2304140030_PSA-Prosperity-Dielectrics-FV31X471K102ECG_C525358.pdf; ComponentLink2Description: JLCPCB Part URL; ComponentLink2URL: https://jlcpcb.com/partdetail/C525358; ComponentLink3Description: LCSC Part URL; ComponentLink3URL: https://lcsc.com/product-detail/Multilayer-Ceramic-Capacitors-MLCC---SMD-SMT_PSAProsperity-Dielectrics-PSAProsperity-Dielectrics-FV31X471K102ECG_C525358.html
footprint CAP-1206 (1206 (3216M) Capacitor)
pins: 1, 2

## FV31X471K202ECG
designator C?  Capacitance: 470pF  (hidden comment: *)
Capacitor, Ceramic (MLCC), 470pF, 2kV, SMD 1206; Manufacturer: PSA(Prosperity Dielectrics); Manufacturer Part Number: FV31X471K202ECG; Package Size: 1206; JLCPCB Basic Part: No; JLCPCB Part Number: C2843400; Supplier 1: LCSC; Category: Capacitors - MLCC; Supplier Part Number 1: C2843400; Voltage Rating: 2kV; RoHS: Yes; ComponentLink1Description: Datasheet; ComponentLink1URL: https://wmsc.lcsc.com/wmsc/upload/file/pdf/v2/lcsc/2108072030_PSA-Prosperity-Dielectrics-FV31X471K202ECG_C2843400.pdf; ComponentLink2Description: JLCPCB Part URL; ComponentLink2URL: https://jlcpcb.com/partdetail/C2843400; ComponentLink3Description: LCSC Part URL; ComponentLink3URL: https://lcsc.com/product-detail/Multilayer-Ceramic-Capacitors-MLCC---SMD-SMT_PSAProsperity-Dielectrics-PSAProsperity-Dielectrics-FV31X471K202ECG_C2843400.html
footprint CAP-1206 (1206 (3216M) Capacitor)
pins: 1, 2

## FV31X472K102ECG
designator C?  Capacitance: 4.7nF  (hidden comment: *)
Capacitor, Ceramic (MLCC), 4.7nF, ±10%, 1kV, X7R, ±10%, SMD 1206; Manufacturer: PSA(Prosperity Dielectrics); Manufacturer Part Number: FV31X472K102ECG; Package Size: 1206; JLCPCB Basic Part: No; JLCPCB Part Number: C382201; Supplier 1: LCSC; Category: Capacitors - MLCC; Supplier Part Number 1: C382201; Tolerance: ±10%; Voltage Rating: 1kV; Temperature Coefficient: X7R; RoHS: Yes; ComponentLink1Description: Datasheet; ComponentLink1URL: https://wmsc.lcsc.com/wmsc/upload/file/pdf/v2/lcsc/2304140030_PSA-Prosperity-Dielectrics-FV31X472K102ECG_C382201.pdf; ComponentLink2Description: JLCPCB Part URL; ComponentLink2URL: https://jlcpcb.com/partdetail/C382201; ComponentLink3Description: LCSC Part URL; ComponentLink3URL: https://lcsc.com/product-detail/Multilayer-Ceramic-Capacitors-MLCC---SMD-SMT_PSAProsperity-Dielectrics-PSAProsperity-Dielectrics-FV31X472K102ECG_C382201.html
footprint CAP-1206 (1206 (3216M) Capacitor)
pins: 1, 2

## FV31X472K202EEQ
designator C?  Capacitance: 4.7nF  (hidden comment: *)
Capacitor, Ceramic (MLCC), 4.7nF, ±10%, 2kV, ±10%, SMD 1206; Manufacturer: PSA(Prosperity Dielectrics); Manufacturer Part Number: FV31X472K202EEQ; Package Size: 1206; JLCPCB Basic Part: No; JLCPCB Part Number: C1021552; Supplier 1: LCSC; Category: Capacitors - MLCC; Supplier Part Number 1: C1021552; Tolerance: ±10%; Voltage Rating: 2kV; RoHS: Yes; ComponentLink1Description: Datasheet; ComponentLink1URL: https://wmsc.lcsc.com/wmsc/upload/file/pdf/v2/lcsc/2304140030_PSA-Prosperity-Dielectrics-FV31X472K202EEQ_C1021552.pdf; ComponentLink2Description: JLCPCB Part URL; ComponentLink2URL: https://jlcpcb.com/partdetail/C1021552; ComponentLink3Description: LCSC Part URL; ComponentLink3URL: https://lcsc.com/product-detail/Multilayer-Ceramic-Capacitors-MLCC---SMD-SMT_PSAProsperity-Dielectrics-PSAProsperity-Dielectrics-FV31X472K202EEQ_C1021552.html
footprint CAP-1206 (1206 (3216M) Capacitor)
pins: 1, 2

## FV31X562K102ECG
designator C?  Capacitance: 5.6nF  (hidden comment: *)
Capacitor, Ceramic (MLCC), 5.6nF, 1kV, X7R, SMD 1206; Manufacturer: PSA(Prosperity Dielectrics); Manufacturer Part Number: FV31X562K102ECG; Package Size: 1206; JLCPCB Basic Part: No; JLCPCB Part Number: C2915721; Supplier 1: LCSC; Category: Capacitors - MLCC; Supplier Part Number 1: C2915721; Voltage Rating: 1kV; Temperature Coefficient: X7R; RoHS: Yes; ComponentLink1Description: Datasheet; ComponentLink1URL: https://wmsc.lcsc.com/wmsc/upload/file/pdf/v2/lcsc/2111161730_PSA-Prosperity-Dielectrics-FV31X562K102ECG_C2915721.pdf; ComponentLink2Description: JLCPCB Part URL; ComponentLink2URL: https://jlcpcb.com/partdetail/C2915721; ComponentLink3Description: LCSC Part URL; ComponentLink3URL: https://lcsc.com/product-detail/Multilayer-Ceramic-Capacitors-MLCC---SMD-SMT_PSAProsperity-Dielectrics-PSAProsperity-Dielectrics-FV31X562K102ECG_C2915721.html
footprint CAP-1206 (1206 (3216M) Capacitor)
pins: 1, 2

## FV31X681K102ECG
designator C?  Capacitance: 680pF  (hidden comment: *)
Capacitor, Ceramic (MLCC), 680pF, ±10%, 1kV, X7R, ±10%, SMD 1206; Manufacturer: PSA(Prosperity Dielectrics); Manufacturer Part Number: FV31X681K102ECG; Package Size: 1206; JLCPCB Basic Part: No; JLCPCB Part Number: C565667; Supplier 1: LCSC; Category: Capacitors - MLCC; Supplier Part Number 1: C565667; Tolerance: ±10%; Voltage Rating: 1kV; Temperature Coefficient: X7R; RoHS: Yes; ComponentLink1Description: Datasheet; ComponentLink1URL: https://wmsc.lcsc.com/wmsc/upload/file/pdf/v2/lcsc/2304140030_PSA-Prosperity-Dielectrics-FV31X681K102ECG_C565667.pdf; ComponentLink2Description: JLCPCB Part URL; ComponentLink2URL: https://jlcpcb.com/partdetail/C565667; ComponentLink3Description: LCSC Part URL; ComponentLink3URL: https://lcsc.com/product-detail/Multilayer-Ceramic-Capacitors-MLCC---SMD-SMT_PSAProsperity-Dielectrics-PSAProsperity-Dielectrics-FV31X681K102ECG_C565667.html
footprint CAP-1206 (1206 (3216M) Capacitor)
pins: 1, 2

## FV31X682K102ECG
designator C?  Capacitance: 6.8nF  (hidden comment: *)
Capacitor, Ceramic (MLCC), 6.8nF, ±10%, 1kV, X7R, ±10%, SMD 1206; Manufacturer: PSA(Prosperity Dielectrics); Manufacturer Part Number: FV31X682K102ECG; Package Size: 1206; JLCPCB Basic Part: No; JLCPCB Part Number: C565668; Supplier 1: LCSC; Category: Capacitors - MLCC; Supplier Part Number 1: C565668; Tolerance: ±10%; Voltage Rating: 1kV; Temperature Coefficient: X7R; RoHS: Yes; ComponentLink1Description: Datasheet; ComponentLink1URL: https://wmsc.lcsc.com/wmsc/upload/file/pdf/v2/lcsc/2304140030_PSA-Prosperity-Dielectrics-FV31X682K102ECG_C565668.pdf; ComponentLink2Description: JLCPCB Part URL; ComponentLink2URL: https://jlcpcb.com/partdetail/C565668; ComponentLink3Description: LCSC Part URL; ComponentLink3URL: https://lcsc.com/product-detail/Multilayer-Ceramic-Capacitors-MLCC---SMD-SMT_PSAProsperity-Dielectrics-PSAProsperity-Dielectrics-FV31X682K102ECG_C565668.html
footprint CAP-1206 (1206 (3216M) Capacitor)
pins: 1, 2

## FV31X821K102ECG
designator C?  Capacitance: 820pF  (hidden comment: *)
Capacitor, Ceramic (MLCC), 820pF, 1kV, X7R, SMD 1206; Manufacturer: PSA(Prosperity Dielectrics); Manufacturer Part Number: FV31X821K102ECG; Package Size: 1206; JLCPCB Basic Part: No; JLCPCB Part Number: C2915722; Supplier 1: LCSC; Category: Capacitors - MLCC; Supplier Part Number 1: C2915722; Voltage Rating: 1kV; Temperature Coefficient: X7R; RoHS: Yes; ComponentLink1Description: Datasheet; ComponentLink1URL: https://wmsc.lcsc.com/wmsc/upload/file/pdf/v2/lcsc/2201121230_PSA-Prosperity-Dielectrics-FV31X821K102ECG_C2915722.pdf; ComponentLink2Description: JLCPCB Part URL; ComponentLink2URL: https://jlcpcb.com/partdetail/C2915722; ComponentLink3Description: LCSC Part URL; ComponentLink3URL: https://lcsc.com/product-detail/Multilayer-Ceramic-Capacitors-MLCC---SMD-SMT_PSAProsperity-Dielectrics-PSAProsperity-Dielectrics-FV31X821K102ECG_C2915722.html
footprint CAP-1206 (1206 (3216M) Capacitor)
pins: 1, 2

## GC331AD72W103KX01D
designator C?  Capacitance: 10nF  (hidden comment: *)
Capacitor, Ceramic (MLCC), 10nF, ±10%, 450V, X7T, ±10%, SMD 1206; Manufacturer: Murata Electronics; Manufacturer Part Number: GC331AD72W103KX01D; Package Size: 1206; JLCPCB Basic Part: No; JLCPCB Part Number: C437418; Supplier 1: LCSC; Category: Capacitors - MLCC; Supplier Part Number 1: C437418; Tolerance: ±10%; Voltage Rating: 450V; Temperature Coefficient: X7T; RoHS: Yes; ComponentLink1Description: Datasheet; ComponentLink1URL: https://wmsc.lcsc.com/wmsc/upload/file/pdf/v2/lcsc/2304140030_Murata-Electronics-GC331AD72W103KX01D_C437418.pdf; ComponentLink2Description: JLCPCB Part URL; ComponentLink2URL: https://jlcpcb.com/partdetail/C437418; ComponentLink3Description: LCSC Part URL; ComponentLink3URL: https://lcsc.com/product-detail/Multilayer-Ceramic-Capacitors-MLCC---SMD-SMT_Murata-Electronics-Murata-Electronics-GC331AD72W103KX01D_C437418.html
footprint CAP-1206 (1206 (3216M) Capacitor)
pins: 1, 2

## GCJ31BR72E683KXJ1L
designator C?  Capacitance: 68nF  (hidden comment: *)
Capacitor, Ceramic (MLCC), 68nF, ±10%, 250V, X7R, ±10%, SMD 1206; Manufacturer: Murata Electronics; Manufacturer Part Number: GCJ31BR72E683KXJ1L; Package Size: 1206; JLCPCB Basic Part: No; JLCPCB Part Number: C161120; Supplier 1: LCSC; Category: Capacitors - MLCC; Supplier Part Number 1: C161120; Tolerance: ±10%; Voltage Rating: 250V; Temperature Coefficient: X7R; RoHS: Yes; ComponentLink1Description: Datasheet; ComponentLink1URL: https://wmsc.lcsc.com/wmsc/upload/file/pdf/v2/lcsc/1810201312_Murata-Electronics-GCJ31BR72E683KXJ1L_C161120.pdf; ComponentLink2Description: JLCPCB Part URL; ComponentLink2URL: https://jlcpcb.com/partdetail/C161120; ComponentLink3Description: LCSC Part URL; ComponentLink3URL: https://lcsc.com/product-detail/Multilayer-Ceramic-Capacitors-MLCC---SMD-SMT_Murata-Electronics-Murata-Electronics-GCJ31BR72E683KXJ1L_C161120.html
footprint CAP-1206 (1206 (3216M) Capacitor)
pins: 1, 2

## GCJ31BR72J102KXJ1L
designator C?  Capacitance: 1nF  (hidden comment: *)
Capacitor, Ceramic (MLCC), 1nF, ±10%, 630V, X7R, ±10%, SMD 1206; Manufacturer: Murata Electronics; Manufacturer Part Number: GCJ31BR72J102KXJ1L; Package Size: 1206; JLCPCB Basic Part: No; JLCPCB Part Number: C464427; Supplier 1: LCSC; Category: Capacitors - MLCC; Supplier Part Number 1: C464427; Tolerance: ±10%; Voltage Rating: 630V; Temperature Coefficient: X7R; RoHS: Yes; ComponentLink1Description: Datasheet; ComponentLink1URL: https://wmsc.lcsc.com/wmsc/upload/file/pdf/v2/lcsc/2304140030_Murata-Electronics-GCJ31BR72J102KXJ1L_C464427.pdf; ComponentLink2Description: JLCPCB Part URL; ComponentLink2URL: https://jlcpcb.com/partdetail/C464427; ComponentLink3Description: LCSC Part URL; ComponentLink3URL: https://lcsc.com/product-detail/Multilayer-Ceramic-Capacitors-MLCC---SMD-SMT_Murata-Electronics-Murata-Electronics-GCJ31BR72J102KXJ1L_C464427.html
footprint CAP-1206 (1206 (3216M) Capacitor)
pins: 1, 2

## GCJ31BR72J103KXJ1L
designator C?  Capacitance: 10nF  (hidden comment: *)
Capacitor, Ceramic (MLCC), 10nF, ±10%, 630V, X7R, ±10%, SMD 1206; Manufacturer: Murata Electronics; Manufacturer Part Number: GCJ31BR72J103KXJ1L; Package Size: 1206; JLCPCB Basic Part: No; JLCPCB Part Number: C415399; Supplier 1: LCSC; Category: Capacitors - MLCC; Supplier Part Number 1: C415399; Tolerance: ±10%; Voltage Rating: 630V; Temperature Coefficient: X7R; RoHS: Yes; ComponentLink1Description: Datasheet; ComponentLink1URL: https://wmsc.lcsc.com/wmsc/upload/file/pdf/v2/lcsc/2304140030_Murata-Electronics-GCJ31BR72J103KXJ1L_C415399.pdf; ComponentLink2Description: JLCPCB Part URL; ComponentLink2URL: https://jlcpcb.com/partdetail/C415399; ComponentLink3Description: LCSC Part URL; ComponentLink3URL: https://lcsc.com/product-detail/Multilayer-Ceramic-Capacitors-MLCC---SMD-SMT_Murata-Electronics-Murata-Electronics-GCJ31BR72J103KXJ1L_C415399.html
footprint CAP-1206 (1206 (3216M) Capacitor)
pins: 1, 2
